# Altium footprint library ST-Link-V1.0.PcbLib: 15 footprints
Each footprint in its own frame and in the unit in brackets; x right, y up, seen from the top. Pads: shape width x height; smd on the part's side, far side on the other; paste and mask are expansions set on the pad; w line width, h text height; cw(c..) or ccw(c..) is an arc to the next point about the centre after c.
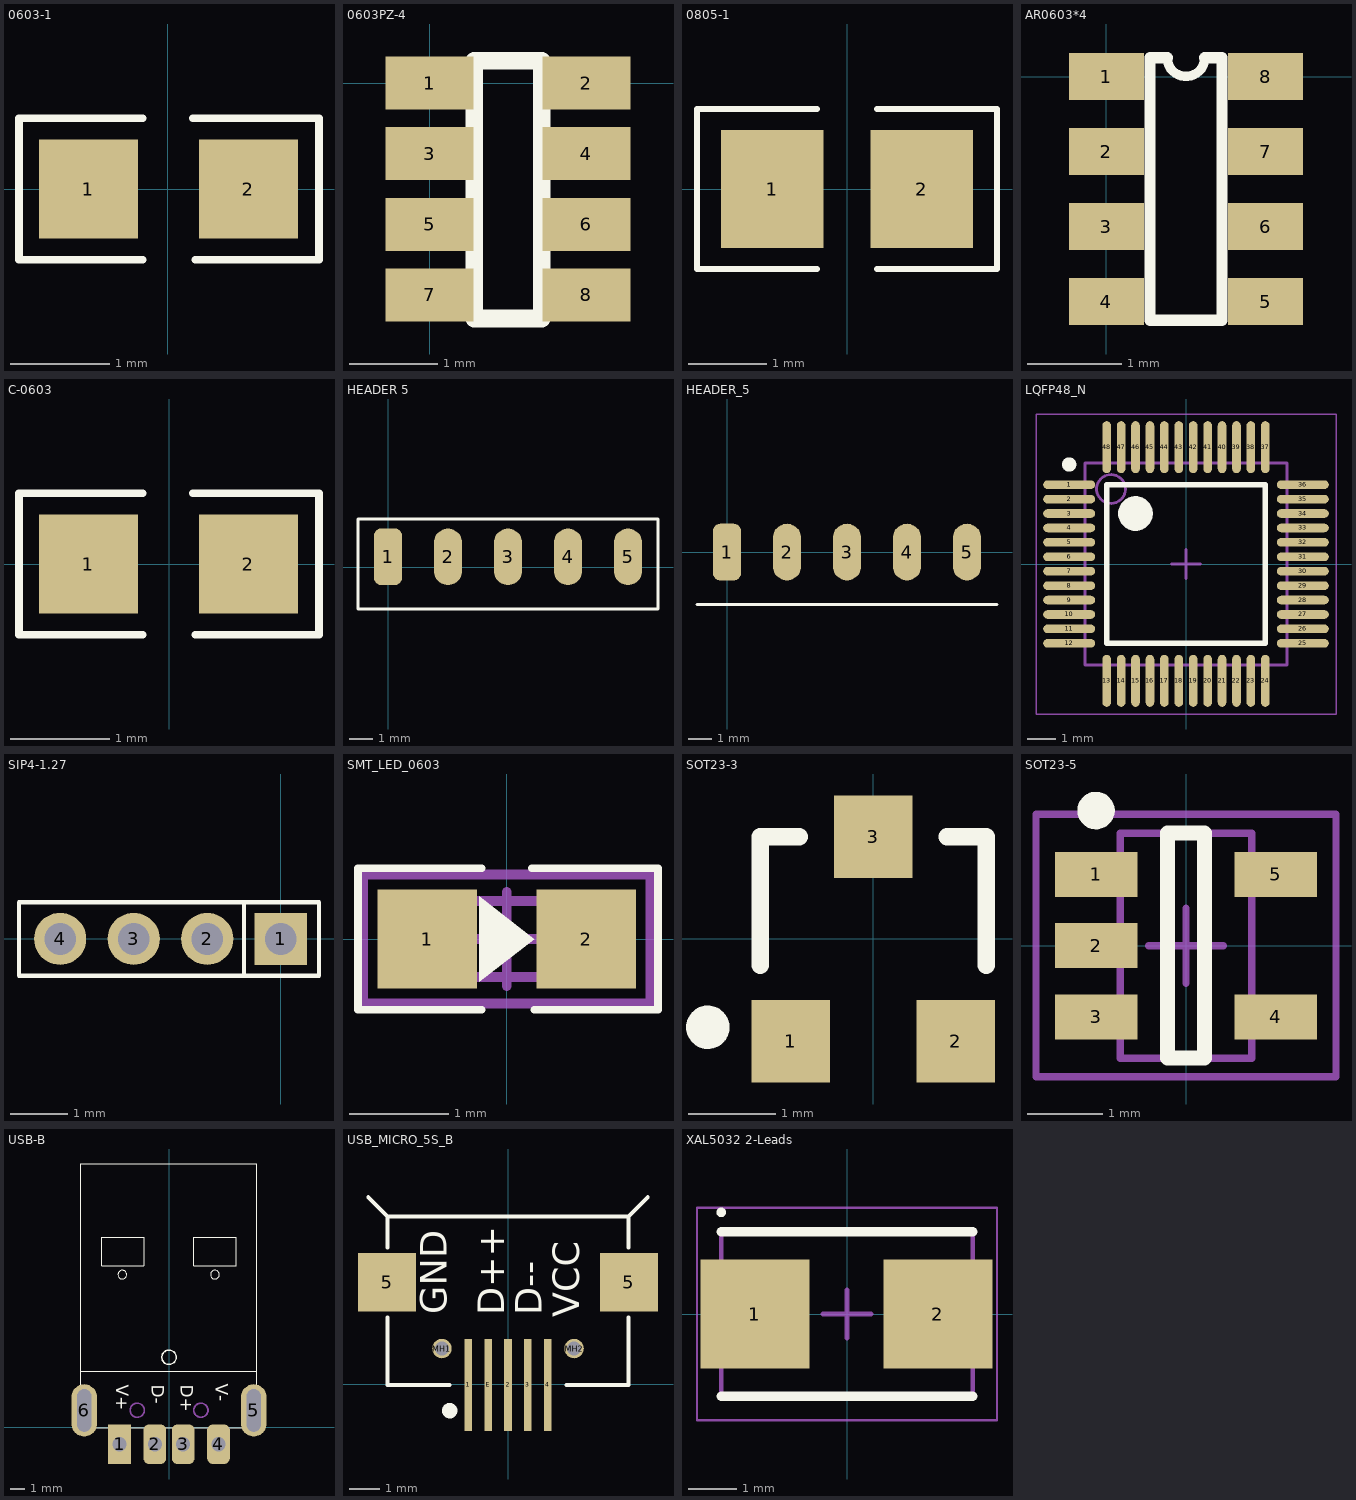
[diagram p0: the footprints below, top view; thin cyan lines are the x and y axes]

## 0603-1 [mm] "0603带丝印"
height 0.6
pads (2):
  rect 1x1 smd: 1(-0.799,0) 2(0.813,0)
Top Overlay:
  lines w0.076: -0.254,-0.711 -1.499,-0.711 -1.499,0.711 -0.254,0.711 ; 0.254,0.711 1.524,0.711 1.524,-0.711 0.279,-0.711
3D body "User Library-0603 SMD Resistor.STEP": height 0.3, standoff 0, extent -0.8,-0.4 0.8,0.4

## 0603PZ-4 [mm]
pads (8):
  rect 1x0.6 smd: 1(0,0) 2(1.778,0) 3(0,-0.8) 4(1.778,-0.8) 5(0,-1.6) 6(1.778,-1.6) 7(0,-2.4) 8(1.778,-2.4)
Top Overlay:
  lines w0.2: 0.508,-2.667 1.27,-2.667 1.27,0.254 0.508,0.254 0.508,-2.667

## 0805-1 [mm] "0805带丝印"
height 1.1
pads (2):
  rect 1.3x1.5 smd: 1(-0.95,0) 2(0.95,0)
Top Overlay:
  lines w0.076: -0.381,-1.016 -1.905,-1.016 -1.905,1.016 -0.381,1.016 ; 0.381,-1.016 1.905,-1.016 1.905,1.016 0.381,1.016
3D body "0805R.STEP": height 0.5, standoff 0, extent -1,-0.625 1,0.625

## AR0603*4 [mm]
pads (8):
  rect 0.8x0.5 smd: 1(0,0) 2(0,-0.8) 3(0,-1.6) 4(0,-2.4) 5(1.7,-2.4) 6(1.7,-1.6) 7(1.7,-0.8) 8(1.7,0)
Top Overlay:
  lines w0.1: 0.65,0.2 ccw(c0.85,0.2) 1.05,0.2
  lines w0.12: 0.65,0.2 0.465,0.2 0.465,-2.6 1.235,-2.6 1.235,0.2 1.05,0.2
3D body "User Library-0603 SMD Resistor.STEP": height 0.3, standoff 0, extent 0.038,-2.813 1.638,-2.013
3D body "User Library-0603 SMD Resistor.STEP": height 0.3, standoff 0, extent 0.038,-2 1.638,-1.2
3D body "User Library-0603 SMD Resistor.STEP": height 0.3, standoff 0, extent 0.038,-1.187 1.638,-0.387
3D body "User Library-0603 SMD Resistor.STEP": height 0.3, standoff 0, extent 0.038,-0.374 1.638,0.426

## C-0603 [mm] "贴片电容"
height 0.6
pads (2):
  rect 1x1 smd: 1(-0.813,0) 2(0.799,0)
Top Overlay:
  lines w0.076: -0.268,-0.711 -1.512,-0.711 -1.512,0.711 -0.268,0.711 ; 0.24,0.711 1.51,0.711 1.51,-0.711 0.266,-0.711
3D body "User Library-0603 SMD Capacitor.STEP": height 0.3, standoff 0, extent -0.8,-0.4 0.8,0.4

## HEADER 5 [mm]
pads (5):
  rrect50% 1.2x2.4 smd: 1(0,0.432)
  oval 1.2x2.4 smd: 2(2.54,0.432) 3(5.08,0.432) 4(7.62,0.432) 5(10.16,0.432)
Top Overlay:
  lines w0.127: -1.27,-1.778 -1.27,-0.762 -1.27,2.032 11.43,2.032 11.43,-1.778 -1.27,-1.778
3D body "1001-5.STEP": height 1.78, standoff -0.76, extent -1.27,-10.318 11.43,1.222

## HEADER_5 [mm]
pads (5):
  rrect50% 1.2x2.4 smd: 1(0,0)
  oval 1.2x2.4 smd: 2(2.54,0) 3(5.08,0) 4(7.62,0) 5(10.16,0)
Top Overlay:
  lines w0.127: -1.27,-2.21 11.43,-2.21
3D body "1001-5.STEP": height 1.78, standoff -0.76, extent -1.27,-10.75 11.43,0.79

## LQFP48_N [mm] "Thin QFP, 48-Leads, Body 7x7mm, Pitch 0.5mm, IPC Medium Density"
height 1.6
pads (48):
  oval 1.8x0.3 smd: 1(-4.05,2.75) 2(-4.05,2.25) 3(-4.05,1.75) 4(-4.05,1.25) 5(-4.05,0.75) 6(-4.05,0.25) 7(-4.05,-0.25) 8(-4.05,-0.75) 9(-4.05,-1.25) 10(-4.05,-1.75) 11(-4.05,-2.25) 12(-4.05,-2.75) 25(4.05,-2.75) 26(4.05,-2.25) 27(4.05,-1.75) 28(4.05,-1.25) 29(4.05,-0.75) 30(4.05,-0.25) 31(4.05,0.25) 32(4.05,0.75) 33(4.05,1.25) 34(4.05,1.75) 35(4.05,2.25) 36(4.05,2.75)
  oval 0.3x1.8 smd: 13(-2.75,-4.05) 14(-2.25,-4.05) 15(-1.75,-4.05) 16(-1.25,-4.05) 17(-0.75,-4.05) 18(-0.25,-4.05) 19(0.25,-4.05) 20(0.75,-4.05) 21(1.25,-4.05) 22(1.75,-4.05) 23(2.25,-4.05) 24(2.75,-4.05) 37(2.75,4.05) 38(2.25,4.05) 39(1.75,4.05) 40(1.25,4.05) 41(0.75,4.05) 42(0.25,4.05) 43(-0.25,4.05) 44(-0.75,4.05) 45(-1.25,4.05) 46(-1.75,4.05) 47(-2.25,4.05) 48(-2.75,4.05)
Top Overlay:
  circle w0.6: c-1.75,1.75 r0.3
  circle w0.25: c-4.05,3.45 r0.125
  lines w0.2: -2.75,-2.75 2.75,-2.75 2.75,2.75 -2.75,2.75 -2.75,-2.75
Mechanical 13:
  circle w0.1: c-2.6,2.6 r0.5
  lines w0.1: -3.5,-3.5 3.5,-3.5 3.5,3.5 -3.5,3.5 -3.5,-3.5
Mechanical 15:
  lines w0.05: -5.2,-5.2 5.2,-5.2 5.2,5.2 -5.2,5.2 -5.2,-5.2
  lines w0.1: -0.5,0 0.5,0 ; 0,-0.5 0,0.5
3D body "LQFP48-7x7.step": height 1.45, standoff 0, extent -4.53,-4.475 4.47,4.525

## SIP4-1.27 [mm]
pads (4):
  rect 0.9x0.9 hole 0.55: 1(0,0)
  round 0.9 hole 0.55: 2(-1.27,0) 3(-2.54,0) 4(-3.81,0)
Top Overlay:
  lines w0.076: -0.635,-0.64 -0.635,0.6 ; -4.521,-0.64 0.66,-0.64 0.66,0.635 -4.521,0.635 -4.521,-0.64

## SMT_LED_0603 [mm] "SMT LED"
height 0.85
pads (2):
  rect 1x1 smd: 1(-0.8,0) 2(0.8,0)
Top Overlay:
  region: -0.279,0.432 0.279,0 -0.279,-0.432
  lines w0.076: -0.254,-0.711 -1.499,-0.711 -1.499,0.711 -0.254,0.711 ; 0.254,0.711 1.524,0.711 1.524,-0.711 0.279,-0.711
Mechanical 13:
  lines w0.1: -1.016,-0.381 -1.016,0.381 1.016,0.381 1.016,-0.381 -1.016,-0.381
Mechanical 15:
  lines w0.1: -0.475,0 0.475,0 ; 0,-0.475 0,0.475 ; -1.448,-0.65 -1.448,0.65 1.448,0.65 1.448,-0.65 -1.448,-0.65
3D body "User Library-0603(1608M) LED.step": height 0.6, standoff 0, extent -0.81,-0.4 0.81,0.4

## SOT23-3 [mm]
height 1.1
pads (3):
  rect 0.9x0.95 smd: 1(-0.95,-1.175) 2(0.95,-1.175) 3(0,1.175)
Top Overlay:
  circle w0.25: c-1.903,-1.016 r0.125
  lines w0.2: -1.3,-0.3 -1.3,1.175 -0.85,1.175 ; 0.85,1.175 1.3,1.175 1.3,-0.3
3D body "SOT23-3.STEP": height 1.2, standoff 0, extent -1.45,-1.4 1.45,1.4

## SOT23-5 [mm] "Max4173"
height 1.45
pads (5):
  rect 1.1x0.6 smd: 1(-1.2,0.95) 2(-1.2,0) 3(-1.2,-0.95) 4(1.2,-0.95) 5(1.2,0.95)
Top Overlay:
  circle w0.25: c-1.2,1.8 r0.125
  lines w0.2: -0.25,-1.5 0.25,-1.5 0.25,1.5 -0.25,1.5 -0.25,-1.5
Mechanical 13:
  lines w0.1: -0.875,-1.5 -0.875,1.5 0.875,1.5 0.875,-1.5 -0.875,-1.5
Mechanical 15:
  lines w0.1: -0.5,0 0.5,0 ; 0,-0.5 0,0.5 ; -2,-1.75 -2,1.75 2,1.75 2,-1.75 -2,-1.75
3D body "SOT23-5.STEP": height 1.2, standoff 0, extent -1.4,-1.45 1.4,1.45

## USB-B [mm]
pads (6):
  rect 1.6x2.8 hole 1: 1(-3.5,-1.195)
  rrect50% 1.6x2.8 hole 1: 2(-1,-1.195) 3(1,-1.195) 4(3.5,-1.195)
  oval 1.8x3.7 hole 1 slot 3 at 90 deg: 5(5.994,1.195) 6(-5.994,1.195)
Top Overlay:
  circle w0.1: c0,4.951 r0.506
  circle w0.05: c-3.304,10.797 r0.307
  circle w0.05: c3.249,10.797 r0.307
  lines w0.05: -6.248,-0.075 -6.223,-0.049 -3.531,-0.049 6.172,-0.049 6.248,-0.125 ; -6.248,-0.049 -6.248,18.62 6.223,18.62 6.223,-0.075 ; -6.248,3.964 -6.235,3.951 0,3.951 6.211,3.951 ; -3.5,-1.195 -3.5,-0.857 ; -1.75,11.438 -1.75,13.438 -4.75,13.438 -4.75,11.438 -1.769,11.438 -1.75,11.457 ; 1.75,11.438 1.75,13.438 4.75,13.438 4.75,11.438 1.75,11.438
  text "D+" at 0.508,2.999 h1.52
  text "V+" at -4.064,2.999 h1.52
  text "V-" at 2.975,3.075 h1.52
  text "D-" at -1.524,2.999 h1.52
Mechanical 1:
  circle w0.127: c-2.245,1.207 r0.5
  circle w0.127: c2.255,1.207 r0.5
  lines w0.127: -6.495,0.007 ccw(c-5.995,0.007) -5.495,0.007 -5.495,1.807 ccw(c-5.995,1.807) -6.495,1.807 -6.495,0.007 ; 5.505,0.007 ccw(c6.005,0.007) 6.505,0.007 6.505,1.807 ccw(c6.005,1.807) 5.505,1.807 5.505,0.007
3D body "USB-AM-S-F-B-TH.step": height 4.52, standoff -1.18, extent -6.25,-1.425 6.25,18.605

## USB_MICRO_5S_B [mm] "USB Micro SMT 5S B"
height 3
pads (9):
  rect 0.25x3 smd: 1(-1.3,-0.022) 2(0,-0.022) 3(0.65,-0.022) 4(1.3,-0.022) E(-0.65,-0.022)
  rect 1.9x1.9 smd: 5(-3.95,3.336) 5(3.95,3.336)
  round 0.635 hole 0.457 unplated: MH1(-2.159,1.168) MH2(2.159,1.168)
Top Overlay:
  circle w0.25: c-1.905,-0.862 r0.125
  lines w0.127: -4.567,6.116 -3.937,5.486 -3.937,4.47 ; -3.937,-0.022 -3.937,2.184 ; -3.9,-0.022 -1.905,-0.022 ; -3.9,5.486 3.9,5.486 ; 1.905,-0.022 3.9,-0.022 ; 3.937,-0.022 3.937,2.184 ; 3.937,4.47 3.937,5.486 4.567,6.116
  text "D++" at 0.178,2.261 h1.5
  text "D--" at 1.397,2.261 h1.5
  text "VCC" at 2.616,2.184 h1.5
  text "GND" at -1.702,2.286 h1.5
3D body "User Library-Micro USB-B_Molex_105017-0001.step": height 2.68, standoff -0.63, extent -4.075,-0.008 4.125,5.422

## XAL5032 2-Leads [mm] "DFN, 2-Leads, Body 3.20x5.00mm, Pitch 3.70mm, IPC Low Density"
height 0.45
pads (2):
  rect 2.25x2.25 smd: 1(-1.905,0) 2(1.88,0)
Top Overlay:
  circle w0.1: c-2.6,2.1 r0.05
  lines w0.2: -2.6,-1.7 2.6,-1.7 ; -2.6,1.7 2.6,1.7
Mechanical 13:
  lines w0.1: -2.6,-1.7 -2.6,1.7 2.6,1.7 2.6,-1.7 -2.6,-1.7
Mechanical 15:
  lines w0.05: -3.1,-2.2 -3.1,2.2 3.1,2.2 3.1,-2.2 -3.1,-2.2
  lines w0.1: -0.5,0 0.5,0 ; 0,-0.5 0,0.5
3D body "User Library-CRYSTALSMD5X32.STEP": height 1, standoff 0, extent -2.5,-1.6 2.5,1.6